# Altium footprint library NDLib.PCBLIB: 499 footprints (part 14 of 32)
Each footprint in its own frame and in the unit in brackets; x right, y up, seen from the top. Pads: shape width x height; smd on the part's side, far side on the other; paste and mask are expansions set on the pad; w line width, h text height; cw(c..) or ccw(c..) is an arc to the next point about the centre after c.
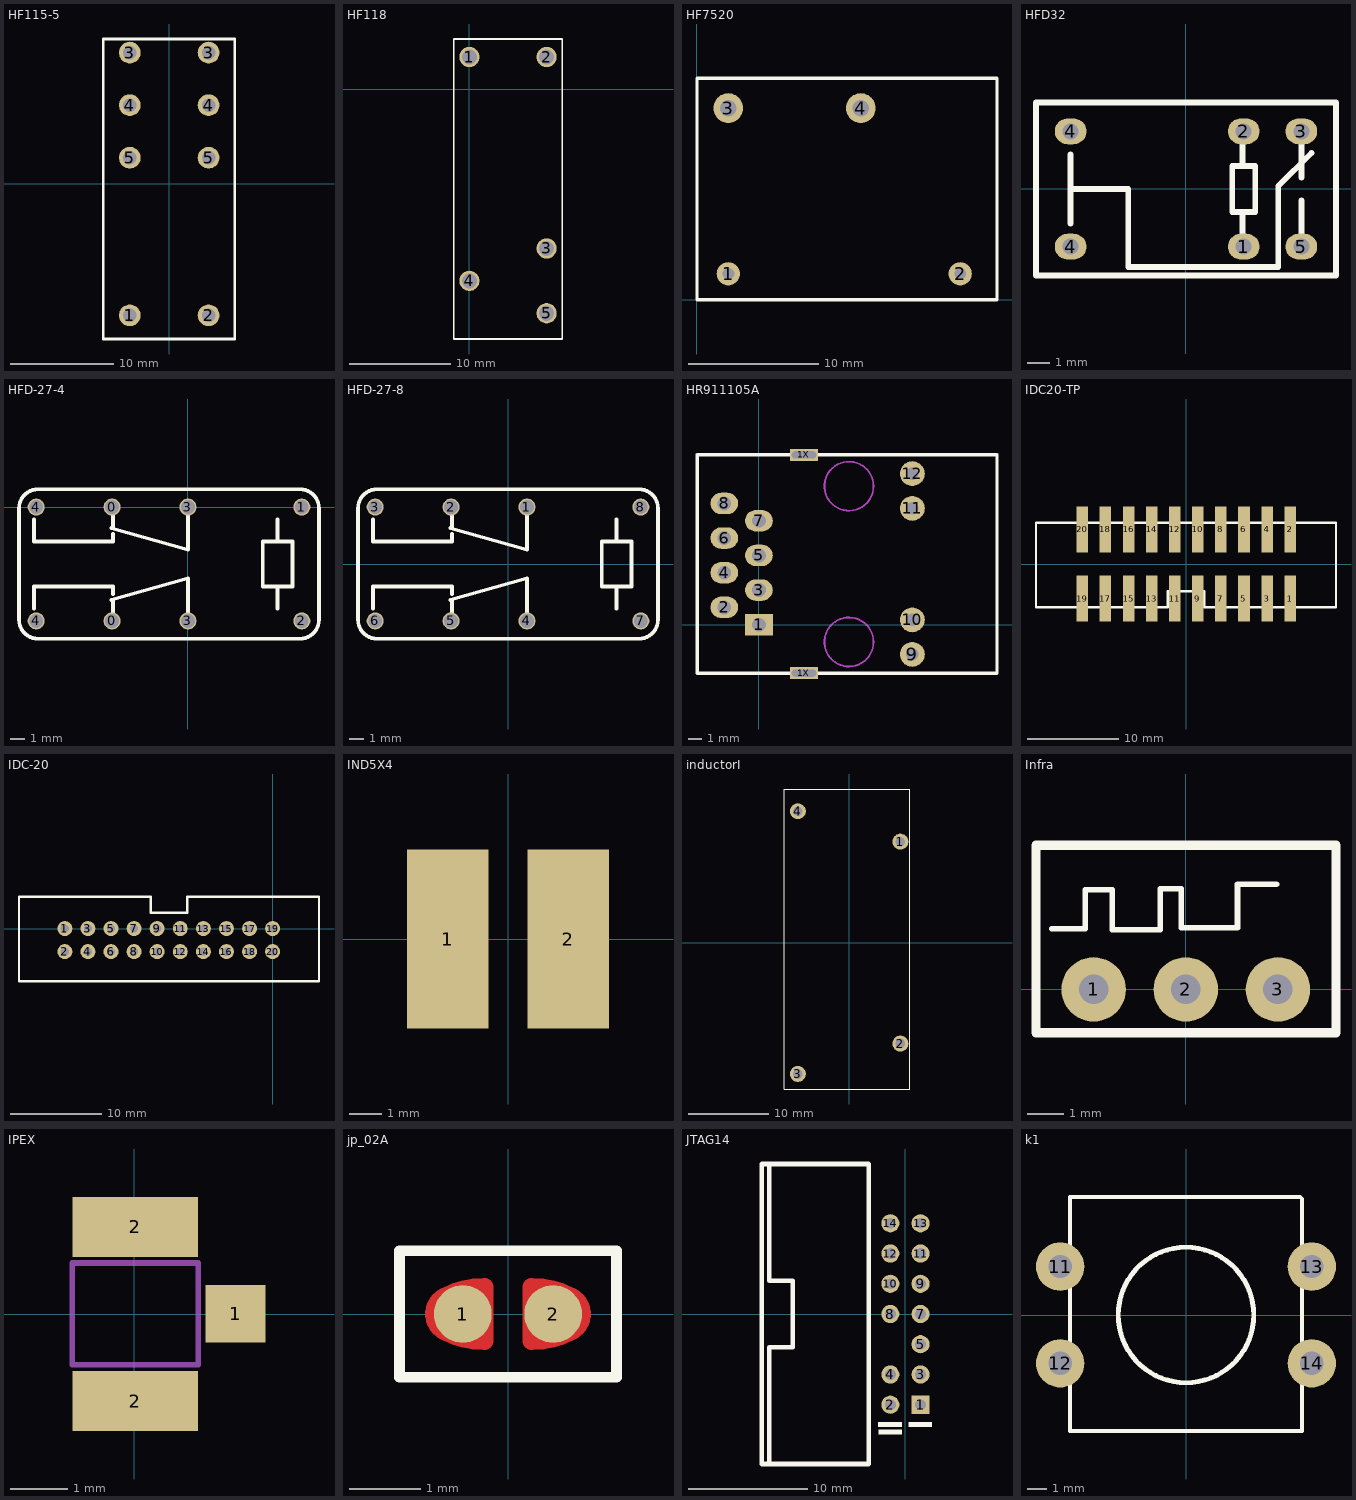
[diagram p13: the footprints below, top view; thin cyan lines are the x and y axes]

## HF115-5 [mm]
height 20
pads (8):
  round 2.1 hole 1.3: 1(-3.81,-12.7) 2(3.81,-12.7) 3(-3.81,12.7) 3(3.81,12.7) 4(-3.81,7.62) 4(3.81,7.62) 5(-3.81,2.54) 5(3.81,2.54)
TopOverlay:
  lines w0.254: -6.367,-14.986 -6.367,14.014 6.333,14.014 6.333,-14.986 -6.367,-14.986

## HF118 [mm]
height 12
pads (5):
  round 2 hole 1.5: 1(0,3.2) 2(7.62,3.2) 3(7.62,-15.7) 4(0,-18.9) 5(7.62,-22.1)
TopOverlay:
  lines w0.152: -1.524,-24.638 9.144,-24.638 9.144,4.978 -1.524,4.978 -1.524,-24.638

## HF7520 [mil]
pads (4):
  round 70 hole 36: 1(94.89,79) 2(794.89,79)
  round 90 hole 50: 3(94.89,579) 4(494.89,579)
TopOverlay:
  lines w10: 0.4,0.26 905.91,0.26 905.91,669.55 0.4,669.55 0.4,0.26

## HFD32 [mil]
height 393.7
pads (6):
  oval 55x45 hole 27.56: 1(100,-100) 2(100,100) 3(200,100) 4(-200,-100) 4(-200,100) 5(200,-100)
TopOverlay:
  lines w10: -200,-60 -200,60 -200,0 -100,0 -100,-135 160,-135 160,5 217.5,62.5 ; 98.12,-100 98.12,-40 ; 98.12,40 98.12,100 ; 200,-100 200,-20 ; 200,20 200,100 ; -260,-150 260,-150 260,150 -260,150 -260,-150 ; 80,-40 120,-40 120,40 80,40 80,-40

## HFD-27-4 [mil]
height 472.44
pads (8):
  round 45 hole 36: 0(-200,-300) 0(-200,0) 1(300,0) 2(300,-300) 3(0,-300) 3(0,0) 4(-400,-300) 4(-400,0)
TopOverlay:
  lines w10: -405.91,-268.11 -405.91,-209.06 -197.64,-209.06 -197.64,-228.74 ; -405.91,-31.89 -405.91,-90.94 -197.64,-90.94 -197.64,-71.26 ; -201.51,-244.63 0,-187.8 0,-300 ; -201.51,-55.37 0,-112.2 0,0 ; -197.64,-277.95 -197.64,-248.43 ; -197.64,-51.57 -197.64,-22.05 ; 196.85,-189.37 196.85,-90.94 275.59,-90.94 275.59,-189.37 ; 196.85,-110.63 196.85,-209.06 275.59,-209.06 275.59,-110.63 ; 236.22,-268.11 236.22,-209.06 ; 236.22,-90.94 236.22,-31.89 ; -445.28,-296.85 ccw(c-395.28,-296.85) -395.28,-346.85 -346.85,-346.85 295.28,-346.85 ccw(c295.28,-296.85) 345.28,-296.85 345.28,-3.15 ccw(c295.28,-3.15) 295.28,46.85 -346.85,46.85 -395.28,46.85 ccw(c-395.28,-3.15) -445.28,-3.15 -445.28,-296.85

## HFD-27-8 [mil]
height 472.44
pads (8):
  round 45 hole 36: 1(50,150) 2(-150,150) 3(-350,150) 4(50,-150) 5(-150,-150) 6(-350,-150) 7(350,-150) 8(350,150)
TopOverlay:
  lines w10: -355.91,-118.11 -355.91,-59.06 -147.64,-59.06 -147.64,-78.74 ; -355.91,118.11 -355.91,59.06 -147.64,59.06 -147.64,78.74 ; -151.51,-94.63 50,-37.8 50,-150 ; -151.51,94.63 50,37.8 50,150 ; -147.64,-127.95 -147.64,-98.43 ; -147.64,98.43 -147.64,127.95 ; 246.85,-39.37 246.85,59.06 325.59,59.06 325.59,-39.37 ; 246.85,39.37 246.85,-59.06 325.59,-59.06 325.59,39.37 ; 286.22,-118.11 286.22,-59.06 ; 286.22,59.06 286.22,118.11 ; -395.28,-146.85 ccw(c-345.28,-146.85) -345.28,-196.85 -296.85,-196.85 345.28,-196.85 ccw(c345.28,-146.85) 395.28,-146.85 395.28,146.85 ccw(c345.28,146.85) 345.28,196.85 -296.85,196.85 -345.28,196.85 ccw(c-345.28,146.85) -395.28,146.85 -395.28,-146.85

## HR911105A [mil]
pads (14):
  rect 80x62 hole 40: 1(0,0)
  rect 80x35 hole 20 slot 70 at 0 deg: 1X(129.92,490.16) 1X(129.92,-139.76)
  oval 80x62 hole 40: 2(-100,50) 3(0,100) 4(-100,150) 5(0,200) 6(-100,250) 7(0,300) 8(-100,350)
  round 72 hole 36: 9(442.91,-85.63) 10(442.91,14) 11(442.91,335.87) 12(442.91,436)
TopOverlay:
  lines w10: -178.74,-140 -178.5,-139.76 ; -178.74,490 -178.58,490.16 ; -178.58,490.16 -178.58,-139.69 -178.5,-139.76 ; -178.58,490.16 129.92,490.16 687.24,490.16 687.4,490 687.4,-140 687.17,-139.76 129.92,-139.76 -178.5,-139.76
KeepOutLayer:
  circle w5: c260,-50 r70.8
  circle w5: c260,400 r70.8
Mechanical1:
  circle w5: c260,-50 r70.8
  circle w5: c260,400 r70.8

## IDC20-TP [mm]
height 34.29
pads (20):
  rect 1.27x5.08 smd: 1(11.43,-3.81) 2(11.43,3.81) 3(8.89,-3.81) 4(8.89,3.81) 5(6.35,-3.81) 6(6.35,3.81) 7(3.81,-3.81) 8(3.81,3.81) 9(1.27,-3.81) 10(1.27,3.81) 11(-1.27,-3.81) 12(-1.27,3.81) 13(-3.81,-3.81) 14(-3.81,3.81) 15(-6.35,-3.81) 16(-6.35,3.81) 17(-8.89,-3.81) 18(-8.89,3.81) 19(-11.43,-3.81) 20(-11.43,3.81)
TopOverlay:
  lines w0.254: -16.53,-4.77 -16.53,-4.37 -16.53,4.53 16.47,4.53 16.47,-4.77 1.97,-4.77 1.97,-3 -2.03,-3 -2.03,-4.77 -16.53,-4.77

## IDC-20 [mil]
pads (20):
  round 65 hole 36: 1(-900,0) 2(-900,-100) 3(-800,0) 4(-800,-100) 5(-700,0) 6(-700,-100) 7(-600,0) 8(-600,-100) 9(-500,0) 10(-500,-100) 11(-400,0) 12(-400,-100) 13(-300,0) 14(-300,-100) 15(-200,0) 16(-200,-100) 17(-100,0) 18(-100,-100) 19(0,0) 20(0,-100)
TopOverlay:
  lines w10: -1098.43,-228.35 200.79,-228.35 200.79,122.05 200.79,137.8 -370.08,137.8 -370.08,68.11 -527.56,68.11 -527.56,137.8 -1098.43,137.8 -1098.43,-228.35

## IND5X4 [mm]
height 4.5
pads (2):
  rect 2.5x5.5 smd: 1(-1.85,0) 2(1.85,0)
3D body: height 4.5, standoff -0.01, extent -2.857,-2.6 2.857,2.6

## inductorI [mm]
height 39
pads (4):
  round 2 hole 1.2: 1(6.4,12.6) 2(6.4,-12.6) 3(-6.4,-16.4) 4(-6.4,16.4)
TopOverlay:
  lines w0.152: -8.125,-18.275 -8.125,19.175 7.6,19.175 7.6,-18.275 -8.125,-18.275

## Infra [mil]
pads (3):
  round 70 hole 32: 1(-100,0) 2(0,0) 3(100,0)
TopOverlay:
  lines w6: -145.67,65.94 -109.25,65.94 -109.25,108.27 -79.72,108.27 -79.72,64.96 -27.56,64.96 -27.56,109.25 -4.92,109.25 -4.92,66.93 56.1,66.93 56.1,114.17 98.43,114.17
  lines w10: -162.56,-47.06 163.01,-47.06 163.01,156.5 -162.56,156.5 -162.56,-47.06

## IPEX [mm]
height 0.508
pads (3):
  rect 1.05x1 smd: 1(1.775,0.003)
  rect 2.2x1.05 smd: 2(0.02,-1.521) 2(0.02,1.521)
Mechanical1:
  lines w0.1: -1.079,-0.886 1.121,-0.886 1.121,0.892 -1.079,0.892 -1.079,-0.886

## jp_02A [mil]
pads (2):
  round 32 smd: 1(-25,0) 2(25,0)
TopLayer:
  lines w6: -13,-17 cw(c-13,33) -35.85,-11.47 cw(c-30,0) -35.83,11.44 cw(c-13,-33) -13,17 ; 13,-17 ccw(c13,33) 35.85,-11.47 ccw(c30,0) 35.83,11.44 ccw(c13,-33) 13,17
  lines w10: -13,-15 -13,15 ; 13,-15 13,15
TopOverlay:
  lines w6: -60,-35 60,-35 60,35 -60,35 -60,-35
TopSolder:
  lines w12: -13,-17 cw(c-13,33) -35.85,-11.47 cw(c-30,0) -35.83,11.44 cw(c-13,-33) -13,17 ; 13,-17 ccw(c13,33) 35.85,-11.47 ccw(c30,0) 35.83,11.44 ccw(c13,-33) 13,17
  lines w15: -13,-15 -13,15 ; 13,-15 13,15

## JTAG14 [mil]
pads (13):
  rect 60x60 hole 36: 1(50,-300)
  round 60 hole 36: 2(-50,-300) 3(50,-200) 4(-50,-200) 5(50,-100) 7(50,0) 8(-50,0) 9(50,100) 10(-50,100) 11(50,200) 12(-50,200) 13(50,300) 14(-50,300)
TopOverlay:
  rectangle: 9.84,-374.02 88.58,-357.87
  rectangle: -90.16,-374.02 -11.42,-357.87
  rectangle: -89.37,-398.82 -10.63,-382.68
  lines w15: -450,496 -450,109.84 -373.03,109.84 -373.03,-109.84 -450,-109.84 ; -450,-109.84 -450,-496 -450,-109.84 ; -475.2,-496 -120.87,-496 -120.87,496 -475.2,496 -475.2,-496

## k1 [mm]
pads (4):
  round 2.5 hole 1.2: 11(-6.506,2.51) 12(-6.506,-2.49) 13(6.494,2.51) 14(6.494,-2.49)
TopOverlay:
  circle w0.254: c-0.006,0.01 r3.5
  lines w0.2: -6.006,-5.99 -6.006,6.11 5.894,6.11 5.994,6.01 5.994,-5.99 -6.006,-5.99